# Altium footprint library 元件1.PcbLib: 420 footprints (part 9 of 27)
Each footprint in its own frame and in the unit in brackets; x right, y up, seen from the top. Pads: shape width x height; smd on the part's side, far side on the other; paste and mask are expansions set on the pad; w line width, h text height; cw(c..) or ccw(c..) is an arc to the next point about the centre after c.
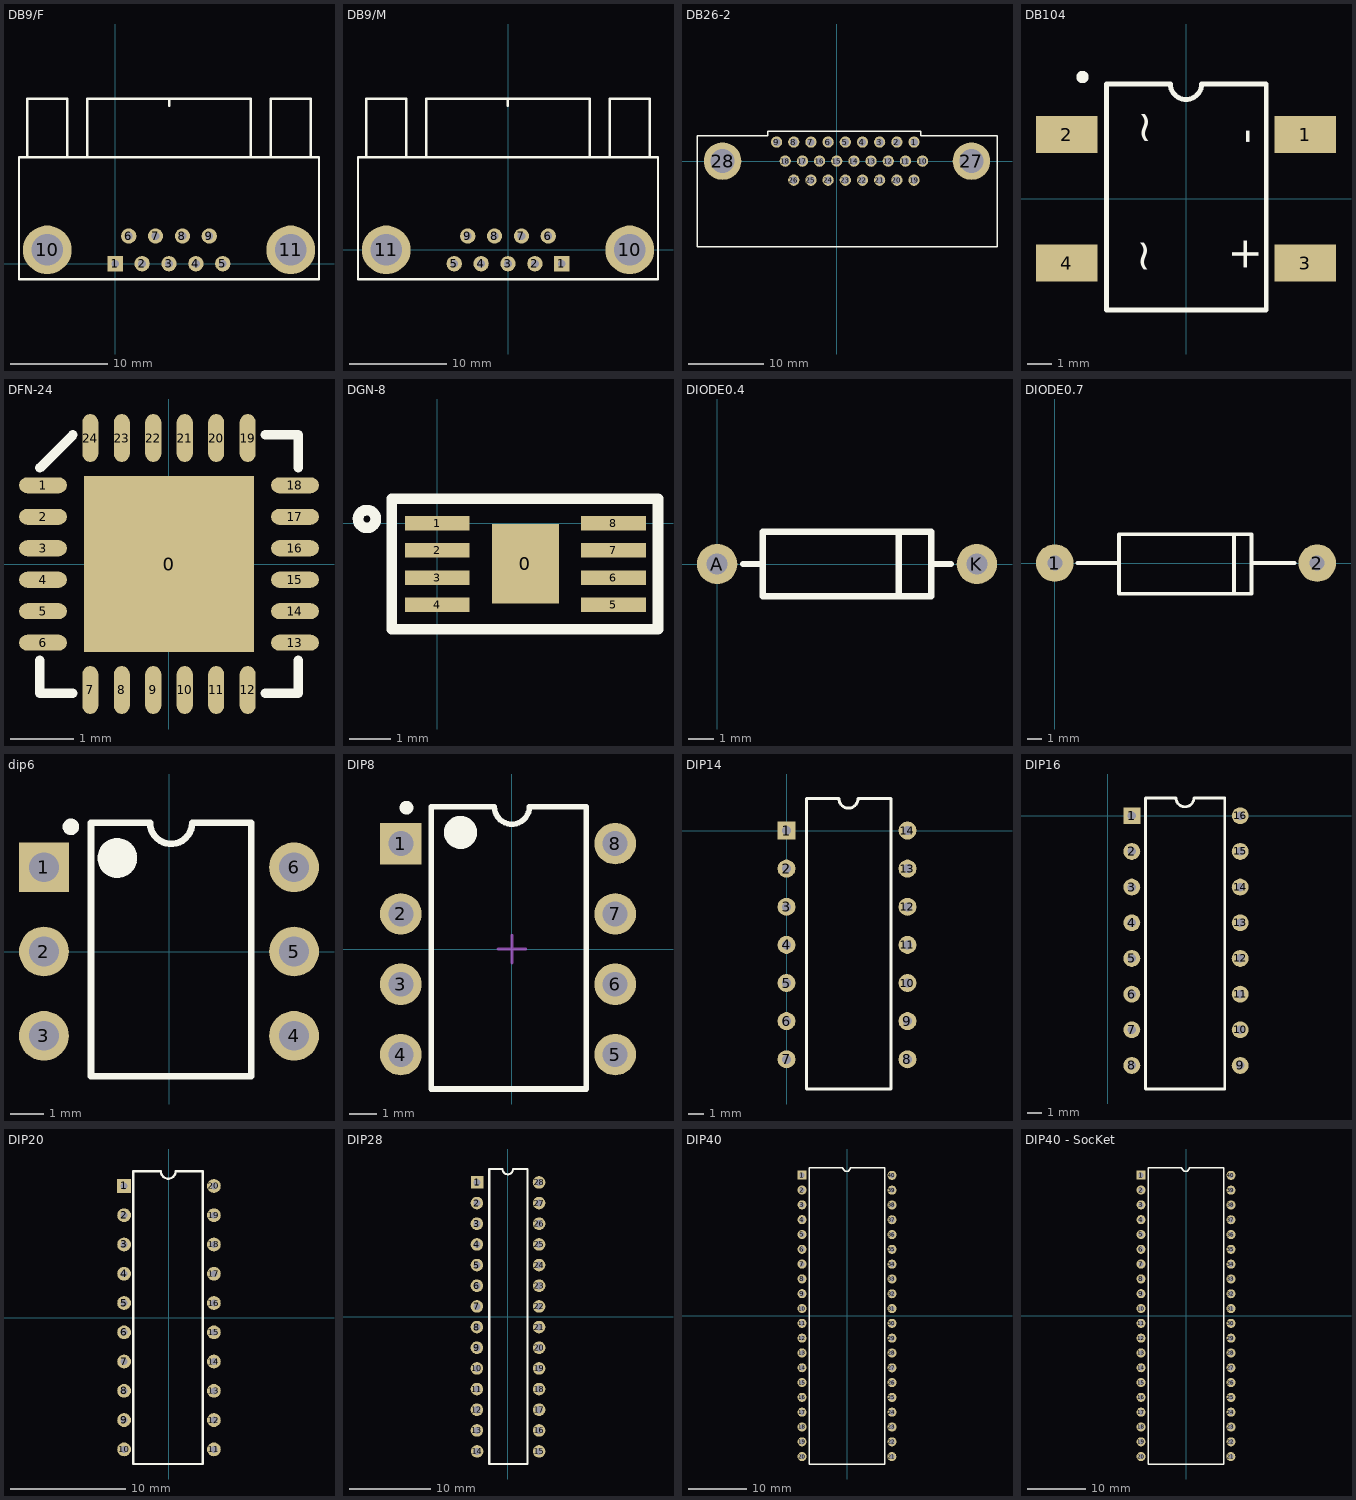
[diagram p8: the footprints below, top view; thin cyan lines are the x and y axes]

## DB9/F [mm]
pads (11):
  rect 1.575x1.575 hole 0.8: 1(0,0)
  round 1.575 hole 0.8: 2(2.76,0) 3(5.52,0) 4(8.28,0) 5(11.04,0) 6(1.38,2.84) 7(4.14,2.84) 8(6.9,2.84) 9(9.66,2.84)
  round 5 hole 3.25: 10(-6.98,1.42) 11(18.02,1.42)
Top Overlay:
  lines w0.254: -9.05,10.92 -9.05,16.92 -4.94,16.92 ; -4.91,10.92 -4.91,16.92 ; -2.85,10.92 -2.85,16.92 13.9,16.92 13.9,10.92 ; 5.525,16.2 5.525,16.9 ; 15.95,10.92 15.95,16.92 20.06,16.92 ; 20.09,10.92 20.09,16.92 ; -9.88,-1.58 20.92,-1.58 20.92,10.92 -9.88,10.92 -9.88,-1.58
3D body "SW3dPS-9-PIN_DSUB-1.STEP": height 12.81, standoff -2.91, extent -9.925,-2.012 20.885,17.063

## DB9/M [mm]
pads (11):
  rect 1.575x1.575 hole 0.8: 1(5.52,-1.42)
  round 1.575 hole 0.8: 2(2.76,-1.42) 3(0,-1.42) 4(-2.76,-1.42) 5(-5.52,-1.42) 6(4.14,1.42) 7(1.38,1.42) 8(-1.38,1.42) 9(-4.14,1.42)
  round 5 hole 3.25: 10(12.5,0) 11(-12.5,0)
Top Overlay:
  lines w0.254: -14.57,9.5 -14.57,15.5 ; -14.54,15.5 -10.43,15.5 -10.43,9.5 ; -8.38,9.5 -8.38,15.5 8.37,15.5 8.37,9.5 ; -0.005,14.78 -0.005,15.48 ; 10.43,9.5 10.43,15.5 ; 10.46,15.5 14.57,15.5 14.57,9.5 ; -15.4,-3 15.4,-3 15.4,9.5 -15.4,9.5 -15.4,-3
3D body "User Library-DB9 RA MALE.step": height 12.55, standoff -3.99, extent -15.384,-2.995 15.502,15.344

## DB26-2 [mm]
pads (28):
  round 1.5 hole 1: 1(10.305,2.54) 2(8.015,2.54) 3(5.725,2.54) 4(3.435,2.54) 5(1.145,2.54) 6(-1.145,2.54) 7(-3.435,2.54) 8(-5.725,2.54) 9(-8.015,2.54) 10(11.45,0) 11(9.16,0) 12(6.87,0) 13(4.58,0) 14(2.29,0) 15(0,0) 16(-2.29,0) 17(-4.58,0) 18(-6.87,0) 19(10.305,-2.54) 20(8.015,-2.54) 21(5.725,-2.54) 22(3.435,-2.54) 23(1.145,-2.54) 24(-1.145,-2.54) 25(-3.435,-2.54) 26(-5.725,-2.54)
  round 5 hole 3.2: 27(17.97,0) 28(-15.23,0)
Top Overlay:
  lines w0.2: -18.63,-11.43 -18.63,3.4 -9.23,3.4 -9.23,4 11.17,4 11.17,3.4 21.37,3.4 21.37,-11.43 -18.63,-11.43
3D body "10090926p264llf.stp": height 4, standoff -12.5, extent -18.228,-17.755 20.972,4.145

## DB104 [mm] "光耦（未加焊）"
height 5.6
pads (4):
  rect 2.5x1.5 smd: 1(4.826,2.604) 2(-4.826,2.604) 3(4.826,-2.603) 4(-4.826,-2.603)
Top Overlay:
  circle w0.25: c-4.191,4.935 r0.125
  lines w0.2: 0.635,4.661 cw(c0,4.661) -0.635,4.661 -3.226,4.661 -3.226,-4.496 3.251,-4.496 3.251,4.661 0.711,4.661
  text "~" at -1.168,-3.048 h1.27
  text "~" at -1.118,2.159 h1.27
  text "-" at 2.997,2.21 h1.27
  text "+" at 2.946,-2.972 h1.27
3D body "User Library-DFS.STEP": height 2.61, standoff 0.02, extent -5.125,-4.111 5.175,4.089

## DFN-24 [mm]
pads (25):
  rect 2.7x2.8 smd: 0(0,0)
  oval 0.762x0.254 smd: 1(-2,1.25) 2(-2,0.75) 3(-2,0.25) 4(-2,-0.25) 5(-2,-0.75) 6(-2,-1.25) 13(2,-1.25) 14(2,-0.75) 15(2,-0.25) 16(2,0.25) 17(2,0.75) 18(2,1.25)
  oval 0.254x0.762 smd: 7(-1.25,-2) 8(-0.75,-2) 9(-0.25,-2) 10(0.25,-2) 11(0.75,-2) 12(1.25,-2) 19(1.25,2) 20(0.75,2) 21(0.25,2) 22(-0.25,2) 23(-0.75,2) 24(-1.25,2)
Top Overlay:
  lines w0.152: -2.05,-1.525 -2.05,-2.05 -1.525,-2.05 ; -2.05,1.525 -1.525,2.05 ; 1.525,-2.05 2.05,-2.05 2.05,-1.525 ; 1.525,2.05 2.05,2.05 2.05,1.525
Mechanical 15:
  lines w0.1: -0.5,0 0.5,0 ; 0,-0.5 0,0.5
3D body "QFN-24.STEP": height 0.95, standoff 0, extent -2.055,-2.06 2.045,2.04

## DGN-8 [mm]
pads (9):
  rect 1.6x1.9 smd: 0(2.108,-0.965)
  rect 1.55x0.35 smd: 1(0,0) 2(0,-0.65) 3(0,-1.3) 4(0,-1.95) 5(4.216,-1.95) 6(4.216,-1.3) 7(4.216,-0.65) 8(4.216,0)
Top Overlay:
  lines w0.254: -1.518,0.233 ccw(c-1.686,0.102) -1.509,0.222 ; -1.092,-2.54 -1.092,0.584 5.283,0.584 5.283,-2.54 -1.092,-2.54
3D body "SW3dPS-MSOP8.STEP": height 1.05, standoff -0.05, extent -0.335,-2.54 4.602,0.56

## DIODE0.4 [mil]
pads (2):
  round 62 hole 32: A(0,0) K(400,0)
Top Overlay:
  lines w10: 40,0 70,0 ; 280,-50 280,50 ; 330,0 360,0 ; 70,-50 70,50 330,50 330,-50 70,-50
3D body "DO-41.STEP": height 58.74, standoff -149.92, extent -19.72,-53.36 415.71,49

## DIODE0.7 [mil]
pads (2):
  round 100 hole 40: 1(0,0) 2(700,0)
Top Overlay:
  lines w10: 60,0 170,0 ; 478,-82 478,77 ; 528,0 640,0 ; 171,-82 171,77 525,77 525,-82 171,-82
3D body "User Library-1N5353B.step": height 151.18, standoff -118.11, extent -17.85,-74.88 721.85,70

## dip6 [mm]
pads (6):
  rect 1.5x1.5 hole 0.9: 1(-3.772,2.54)
  round 1.5 hole 0.9: 2(-3.772,0) 3(-3.772,-2.54) 4(3.772,-2.54) 5(3.772,0) 6(3.772,2.54)
Top Overlay:
  circle w0.25: c-2.957,3.759 r0.125
  circle w0.6: c-1.557,2.819 r0.3
  lines w0.2: -2.349,-3.759 -2.349,3.88 -0.572,3.88 ccw(c0.064,3.88) 0.699,3.88 2.476,3.88 2.476,-3.759 -2.349,-3.759
3D body "DIP-6.STEP": height 4.31, standoff -3.28, extent -4.038,-3.991 3.962,4.089

## DIP8 [mm]
pads (8):
  rect 1.5x1.5 hole 0.9: 1(-4.013,3.81)
  round 1.5 hole 0.9: 2(-4.013,1.27) 3(-4.013,-1.27) 4(-4.013,-3.81) 5(3.734,-3.81) 6(3.734,-1.27) 7(3.734,1.27) 8(3.734,3.81)
Top Overlay:
  circle w0.25: c-3.81,5.11 r0.125
  circle w0.6: c-1.854,4.216 r0.3
  lines w0.2: -2.921,-5.055 -2.921,5.15 -0.635,5.15 ccw(c0,5.15) 0.635,5.15 2.692,5.15 2.692,-5.055 -2.921,-5.055
Mechanical 15:
  lines w0.1: -0.5,0 0.5,0 ; 0,-0.5 0,0.5
3D body "DIP8test.STEP": height 4.57, standoff -3.81, extent -4.062,-4.879 3.758,5.031

## DIP14 [mm]
pads (14):
  rect 1.2x1.2 hole 0.6: 1(0,0)
  round 1.2 hole 0.6: 2(0,-2.54) 3(0,-5.08) 4(0,-7.62) 5(0,-10.16) 6(0,-12.7) 7(0,-15.24) 8(8.062,-15.24) 9(8.062,-12.7) 10(8.062,-10.16) 11(8.062,-7.62) 12(8.062,-5.08) 13(8.062,-2.54) 14(8.062,0)
Top Overlay:
  lines w0.2: 1.321,-17.221 1.321,2.134 3.493,2.134 ccw(c4.128,2.134) 4.763,2.134 6.96,2.134 6.96,-17.221 1.321,-17.221
3D body "DIP14.step": height 4.19, standoff -2.67, extent 0.102,-17.12 7.976,1.93

## DIP16 [mm]
pads (16):
  rect 1.2x1.2 hole 0.6: 1(1.719,0)
  round 1.2 hole 0.6: 2(1.719,-2.54) 3(1.719,-5.08) 4(1.719,-7.62) 5(1.719,-10.16) 6(1.719,-12.7) 7(1.719,-15.24) 8(1.719,-17.78) 9(9.433,-17.78) 10(9.433,-15.24) 11(9.433,-12.7) 12(9.433,-10.16) 13(9.433,-7.62) 14(9.433,-5.08) 15(9.433,-2.54) 16(9.433,0)
Top Overlay:
  lines w0.2: 2.692,-19.456 2.692,1.27 4.865,1.27 ccw(c5.5,1.27) 6.135,1.27 8.331,1.27 8.331,-19.456 2.692,-19.456
3D body "User Library-DIP16-300.step": height 5.08, standoff -2.49, extent 1.554,-18.628 9.424,1.371

## DIP20 [mm]
pads (20):
  rect 1.2x1.2 hole 0.6: 1(-3.895,11.43)
  round 1.2 hole 0.6: 2(-3.895,8.89) 3(-3.895,6.35) 4(-3.895,3.81) 5(-3.895,1.27) 6(-3.895,-1.27) 7(-3.895,-3.81) 8(-3.895,-6.35) 9(-3.895,-8.89) 10(-3.895,-11.43) 11(3.895,-11.43) 12(3.895,-8.89) 13(3.895,-6.35) 14(3.895,-3.81) 15(3.895,-1.27) 16(3.895,1.27) 17(3.895,3.81) 18(3.895,6.35) 19(3.895,8.89) 20(3.895,11.43)
Top Overlay:
  lines w0.2: -3.1,-12.7 2.92,-12.7 2.92,12.7 0.572,12.7 cw(c-0.064,12.7) -0.699,12.7 -3.1,12.7 -3.1,-12.7
3D body "DIP-20-300.STEP": height 4.5, standoff -3.5, extent -3.907,-12.622 3.854,12.978

## DIP28 [mil]
pads (28):
  rect 61x61 hole 35: 1(-149.24,650.1)
  round 61 hole 35: 2(-150.36,550.19) 3(-150.36,450.29) 4(-150.36,350.39) 5(-150.36,250.48) 6(-150.36,150.58) 7(-150.36,50.68) 8(-150.36,-49.23) 9(-150.36,-149.13) 10(-150.36,-249.04) 11(-150.36,-348.94) 12(-150.36,-448.84) 13(-150.36,-548.75) 14(-149.24,-650.1) 15(150.36,-650.1) 16(150.36,-548.75) 17(150.36,-448.84) 18(150.36,-348.94) 19(150.36,-249.04) 20(150.36,-149.13) 21(150.36,-49.23) 22(150.36,50.68) 23(150.36,150.58) 24(150.36,250.48) 25(150.36,350.39) 26(150.36,450.29) 27(150.36,550.19) 28(149.97,650.1)
Top Overlay:
  lines w10: -26.21,714.29 -90.63,714.29 -90.63,-711.12 93.87,-711.12 93.87,715.28 24.97,715.28 ; -26.01,714.08 ccw(c-1.01,714.08) 23.99,714.08
3D body "DIP28-300.step": height 200, standoff -98.03, extent -155.54,-708.17 154.31,709.15

## DIP40 [mil]
pads (40):
  rect 61x61 hole 35: 1(-303.88,950.19)
  round 61 hole 35: 2(-303.62,850.17) 3(-303.62,750.15) 4(-303.62,650.13) 5(-303.62,550.11) 6(-303.62,450.09) 7(-303.62,350.07) 8(-303.62,250.05) 9(-303.62,150.03) 10(-303.62,50.01) 11(-303.62,-50.01) 12(-303.62,-150.03) 13(-303.62,-250.05) 14(-303.62,-350.07) 15(-303.62,-450.09) 16(-303.62,-550.11) 17(-303.62,-650.13) 18(-303.62,-750.15) 19(-303.62,-850.17) 20(-303.62,-950.19) 21(303.04,-950.19) 22(303.88,-850.21) 23(303.88,-750.23) 24(303.88,-650.25) 25(303.88,-550.28) 26(303.88,-450.3) 27(303.88,-350.32) 28(303.88,-250.34) 29(303.88,-150.36) 30(303.88,-50.39) 31(303.88,49.59) 32(303.88,149.57) 33(303.88,249.55) 34(303.88,349.53) 35(303.88,449.5) 36(303.88,549.48) 37(303.88,649.46) 38(303.88,749.44) 39(303.88,849.42) 40(303.88,949.39)
Top Overlay:
  lines w10: -254.04,-1000.19 -254.04,1001.06 -28.21,1001.06 ccw(c-3.21,1001.06) 21.79,1001.06 253.88,1001.06 253.88,-1000.19 -254.04,-1000.19
3D body "DIP40.step": height 224.41, standoff -101.57, extent -303.72,-1026.29 306.12,1038.67

## DIP40 - SocKet [mil]
pads (40):
  rect 61x61 hole 35: 1(-303.88,950.19)
  round 61 hole 35: 2(-303.62,850.17) 3(-303.62,750.15) 4(-303.62,650.13) 5(-303.62,550.11) 6(-303.62,450.09) 7(-303.62,350.07) 8(-303.62,250.05) 9(-303.62,150.03) 10(-303.62,50.01) 11(-303.62,-50.01) 12(-303.62,-150.03) 13(-303.62,-250.05) 14(-303.62,-350.07) 15(-303.62,-450.09) 16(-303.62,-550.11) 17(-303.62,-650.13) 18(-303.62,-750.15) 19(-303.62,-850.17) 20(-303.62,-950.19) 21(303.04,-950.19) 22(303.88,-850.21) 23(303.88,-750.23) 24(303.88,-650.25) 25(303.88,-550.28) 26(303.88,-450.3) 27(303.88,-350.32) 28(303.88,-250.34) 29(303.88,-150.36) 30(303.88,-50.39) 31(303.88,49.59) 32(303.88,149.57) 33(303.88,249.55) 34(303.88,349.53) 35(303.88,449.5) 36(303.88,549.48) 37(303.88,649.46) 38(303.88,749.44) 39(303.88,849.42) 40(303.88,949.39)
Top Overlay:
  lines w10: -254.04,-1000.19 -254.04,1001.06 -28.21,1001.06 ccw(c-3.21,1001.06) 21.79,1001.06 253.88,1001.06 253.88,-1000.19 -254.04,-1000.19
3D body "DIP40-600-1.step": height 188.98, standoff -137.8, extent -347.46,-999.03 345.46,997.03